# Altium footprint library d1_PcbLib.PcbLib: 266 footprints (part 10 of 17)
Each footprint in its own frame and in the unit in brackets; x right, y up, seen from the top. Pads: shape width x height; smd on the part's side, far side on the other; paste and mask are expansions set on the pad; w line width, h text height; cw(c..) or ccw(c..) is an arc to the next point about the centre after c.
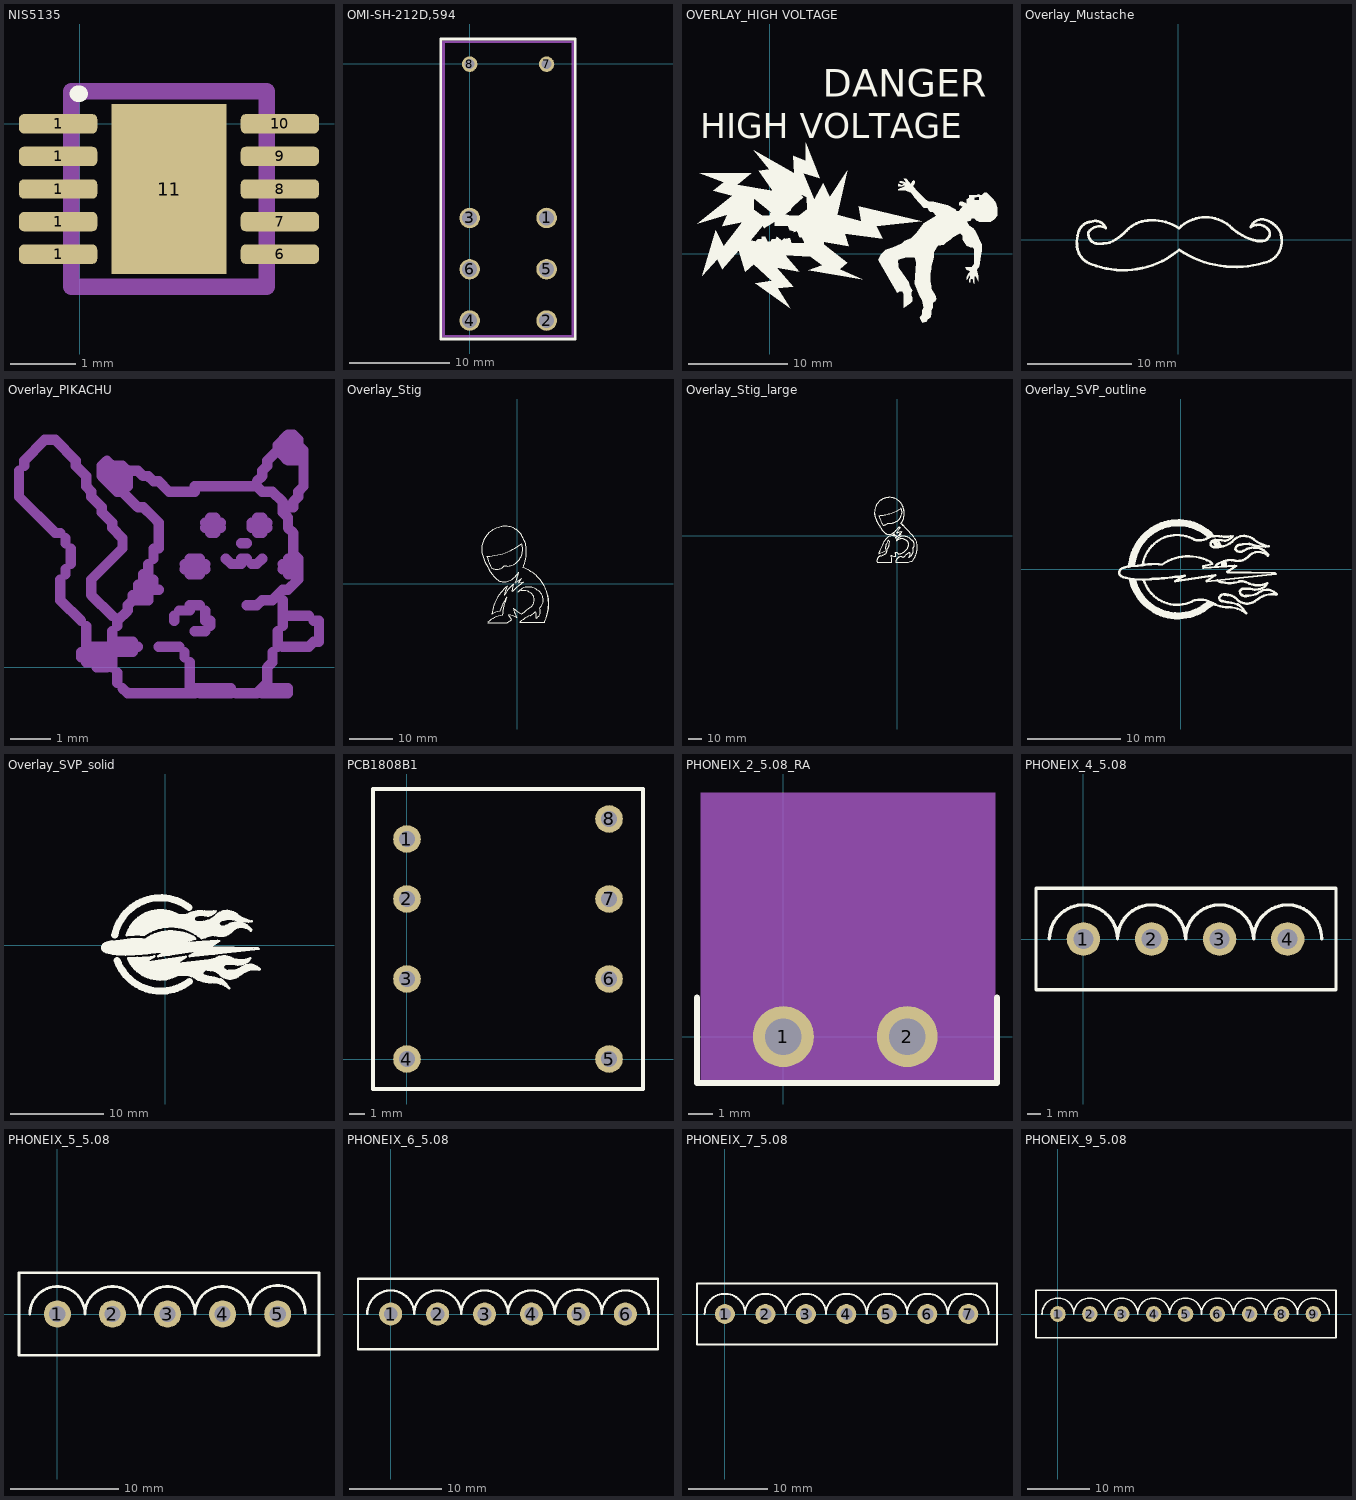
[diagram p9: the footprints below, top view; thin cyan lines are the x and y axes]

## NIS5135 [mm]
pads (11):
  rrect50% 1.2x0.297 smd: 1(-0.33,-2) 1(-0.33,-1.5) 1(-0.33,-1) 1(-0.33,-0.5) 1(-0.33,0) 6(3.07,-2) 7(3.07,-1.5) 8(3.07,-1) 9(3.07,-0.5) 10(3.07,0)
  rect 1.768x2.6 smd: 11(1.37,-1)
Top Overlay:
  lines w0.254: -0.025,0.457 0,0.457
Mechanical 13:
  lines w0.254: -0.13,-2.5 -0.13,0.5 2.87,0.5 2.87,-2.5 -0.13,-2.5
3D body: height 1, standoff 0, extent -0.13,-2.499 2.869,0.499

## OMI-SH-212D,594 [mil]
pads (8):
  round 80 hole 59: 1(299.57,-600.99) 2(299.57,-1000.99) 3(-0.43,-600.99) 4(-0.43,-1000.99) 5(299.57,-800.99) 6(-0.43,-800.99)
  round 60 hole 39: 7(299.57,-0.99) 8(-0.43,-0.99)
Top Overlay:
  lines w10: -113.43,-1072.99 -113.43,97.01 411.57,97.01 411.57,-1072.99 -113.43,-1072.99
Mechanical 1:
  lines w10: -102.43,-1062.99 -102.43,87.01 401.57,87.01 401.57,-1062.99 -102.43,-1062.99
3D body: height 811, standoff 0, extent -102.43,-1062.99 401.57,87.01
3D body: height 0, standoff -157, extent -12.42,-12.99 11.58,11.01
3D body: height 0, standoff -157, extent 287.58,-12.99 311.58,11.01
3D body: height 0, standoff -157, extent -19.93,-606.99 19.07,-594.99
3D body: height 0, standoff -157, extent -19.93,-806.99 19.07,-794.99
3D body: height 0, standoff -157, extent -19.93,-1006.99 19.07,-994.99
3D body: height 0, standoff -157, extent 280.07,-1006.99 319.07,-994.99
3D body: height 0, standoff -157, extent 280.07,-806.99 319.07,-794.99
3D body: height 0, standoff -157, extent 280.07,-606.99 319.07,-594.99

## OVERLAY_HIGH VOLTAGE [mm] "Scary Shocky Guy"
Top Overlay:
  drawing of 13 lines, arcs and shapes, not listed
  text "HIGH VOLTAGE" at -6.973,11.609 h2.54
  text "DANGER" at 5.346,15.8 h2.79

## Overlay_Mustache [mm]
Top Overlay:
  lines w0.254: -9.689,-0.655 ccw(c-7.696,-0.406) -8.331,-2.311 ccw(c-5.283,5.436) 0.09,-0.923 ; -9.667,-0.652 cw(c-6.81,-0.191) -9.565,0.696 cw(c-8.204,0.356) -8.331,1.753 cw(c-7.95,0.737) -6.934,1.118 ccw(c-7.569,0.102) -8.585,0.737 ccw(c-7.677,0.565) -7.848,-0.344 ccw(c-7.518,3.873) -6.54,-0.242 ccw(c-8.503,4.153) -4.959,0.896 cw(c-2.72,-1.216) -2.926,1.855 cw(c-2.426,-2.502) 0.051,1.118 cw(c2.591,-1.422) 5.131,1.118 ccw(c8.56,4.928) 7.53,-0.094 ccw(c7.757,2.741) 8.229,-0.063 ccw(c7.995,0.629) 8.687,0.864 ccw(c7.607,0.165) 6.909,1.245 cw(c7.988,0.8) 8.433,1.88 cw(c7.798,-0.025) 9.218,1.395 cw(c7.925,-0.129) 9.724,0.741 ; 0.137,-0.978 ccw(c5.448,7.023) 8.179,-2.184 ccw(c7.798,-0.152) 9.861,-0.281 ccw(c6.987,-0.106) 9.737,0.747

## Overlay_PIKACHU [mm]
Bottom Overlay:
  drawing of 362 lines, arcs and shapes, not listed

## Overlay_Stig [mm]
Top Overlay:
  lines w0.076: 6.239,-8.934 ccw(c-2.61,-4.606) 6.831,-1.793
  lines w0.254: -7.073,6.4 ccw(c-7.417,19.863) 0.965,9.322 cw(c-2.718,7.925) -1.321,4.242 cw(c-2.21,7.29) -3.066,4.232 cw(c-4.792,5.46) -6.02,3.734 cw(c2.934,8.877) -7.071,6.321 ; -6.925,-9.009 -2.39,-9.009 ccw(c-14.083,10.66) -1.315,-8.328 ccw(c-6.909,-11.113) -1.956,-7.303 ; -6.925,-8.947 cw(c-1.886,-14.975) -3.497,-7.285 cw(c8.077,-7.95) -2.464,-3.124 ccw(c9.538,-11.316) -4.12,-6.356 ; -5.946,-7.056 cw(c4.013,-8.331) -2.366,-0.578 ; -5.892,-7.063 cw(c-1.484,-15.25) -4.128,-6.336 ; -3.732,13.219 cw(c-2.752,9.059) -0.33,12.581 ; -3.169,13.298 ccw(c-2.352,6.582) -5.32,12.661 ccw(c-3.111,7.975) -7.798,5.766 ccw(c9.284,12.814) -5.473,1.692 ccw(c-3.021,3.519) -1.194,1.067 ccw(c-6.147,7.29) 0.301,2.633 cw(c-12.977,5.582) -0.386,0.436 ; -3.096,-2.657 cw(c9.919,-5.982) -2.374,-0.568 ; -3.051,-2.669 cw(c7.252,-8.903) -0.94,-0.076 ccw(c12.649,-4.394) -1.358,-1.726 ; -1.966,-7.167 cw(c-3.808,-14.723) -0.151,-7.859 cw(c7.633,-3.823) -0.94,-5.664 ccw(c4.775,0.305) 0.849,-6.967 ; -1.244,-1.804 cw(c10.363,-13.411) 1.346,0.305 ccw(c2.87,-9.474) 0.338,0.093 ; -0.463,0.283 ccw(c-11.862,17.958) 0.838,1.194 ccw(c15.443,-7.823) 0.24,0.144 ; -0.305,12.613 cw(c-3.828,8.075) 1.483,10.266 cw(c-3.088,7.82) 2.097,7.83 cw(c-8.242,7.607) 1.346,3.734 cw(c-2.492,-5.058) 2.118,3.355 cw(c-1.254,-4.607) 2.813,3.023 cw(c-2.328,-5.731) 3.766,2.389 cw(c-2.105,-5.254) 4.602,1.666 cw(c-2.406,-5.514) 5.3,0.912 cw(c-3.203,-5.67) 6.01,-0.125 cw(c-1.695,-4.944) 6.801,-1.718 ; 0.576,-8.896 6.299,-8.896 ccw(c-1.794,-4.74) 6.708,-7.979 ccw(c-1.829,-4.803) 6.975,-7.139 ccw(c-1.657,-4.771) 7.17,-6.254 ccw(c-2.386,-4.807) 7.278,-4.653 ccw(c-0.961,-4.378) 7.266,-3.866 ccw(c-1.208,-4.486) 7.121,-2.807 ccw(c-3.545,-5.663) 6.773,-1.729 ; 0.576,-8.887 cw(c5.99,-14.969) 2.977,-7.404 ccw(c-6.083,5.448) 4.186,-6.46 ; 0.981,-7.003 ccw(c-10.655,8.877) 2.616,-5.664 ccw(c1.791,-3.696) 3.759,-2.87 ccw(c1.473,-4.267) 0.076,-1.981 cw(c2.616,-4.013) 4.648,-1.473 cw(c3.378,-3.759) 5.163,-5.671 cw(c3.633,-6.419) 4.381,-7.949 ccw(c-0.586,-7.565) 4.282,-6.506

## Overlay_Stig_large [mm]
Top Overlay:
  lines w0.254: -17.043,16.815 ccw(c-11.836,16.688) -16.661,14.725 ; -16.936,15.923 cw(c-5.74,17.323) -11.582,26.975 ; -16.743,14.864 ccw(c-8.852,16.624) -16.311,13.505 ; -16.408,13.767 ccw(c-10.185,15.418) -15.908,12.467 ccw(c-11.601,13.248) -15.19,10.742 ccw(c-11.152,12.09) -14.438,9.383 ccw(c-4.851,13.193) -13.223,7.165 ; -13.624,-13.455 cw(c12.04,-19.507) -10.835,-6.393 ; -13.106,6.909 ccw(c-8.153,9.957) -12.757,6.403 ccw(c-0.294,13.657) -11.647,4.766 ; -13,-11.159 ccw(c3.081,-17.857) -13.843,-13.73 ccw(c-25.064,15.754) -8.874,-11.322 ; -12.598,-15.316 ccw(c-14.757,-4.521) -8.435,-13.534 ccw(c-13.545,-9.897) -7.273,-9.855 ccw(c-12.476,-5.66) -6.162,-7.853 ; -12.344,-15.316 ccw(c-11.328,-18.999) -15.011,-20.015 -3.962,-20.015 ccw(c-28.473,-20.142) -4.519,-14.946 ccw(c-1.262,-5.709) -1.158,-15.503 ccw(c-4.305,-14.653) -1.436,-13.106 ; -12.09,26.721 cw(c-5.867,17.45) 3.404,23.673 ; -11.963,5.258 ccw(c-3.327,9.703) -8.82,1.692 ; -11.21,-7.009 cw(c8.362,-16.985) -9.908,-4.787 cw(c1.314,-10.456) -7.102,-1.116 cw(c-1.994,-13.983) -3.327,-0.203 cw(c-2.184,-0.33) -2.057,0.813 ; -9.677,2.464 ccw(c-6.375,4.877) -5.813,0.826 ; -8.621,-11.139 cw(c2.212,-9.441) -8.616,-7.711 cw(c6.96,-12.903) -6.502,-3.505 ccw(c-1.168,-0.076) -5.894,-4.304 ; -6.205,-7.963 cw(c12.103,-7.252) -5.994,-4.394 ; -4.715,0.892 cw(c-5.516,5.047) -5.813,0.826 ; -3.708,1.448 ccw(c-8.026,8.941) -1.132,3.72 ; -2.86,-0.66 cw(c7.087,-6.68) -1.803,0.813 ; -2.61,-0.62 cw(c-0.152,-5.664) -0.66,-0.076 ccw(c3.531,-2.489) -1.289,-2.095 ; -1.355,-13.063 cw(c-0.597,-14.872) 1.118,-13.919 ccw(c-0.343,-4.458) 8.55,-8.003 ; -1.197,-2.103 cw(c4.928,-7.315) 2.769,0.432 ; -1.126,10.246 cw(c-6.156,20.43) -6.851,9.092 cw(c-13.921,21.974) -10.444,7.697 cw(c2.642,17.704) -13.614,15.037 ccw(c-16.027,50.978) 2.838,20.291 ; -0.905,10.321 ccw(c-5.232,18.212) 3.658,16.815 ; -0.66,-4.267 cw(c3.467,-8.014) 7.214,-3.886 cw(c5.245,-6.744) 8.103,-8.712 ; -0.66,-4.013 cw(c4.42,-5.918) 4.555,-0.494 ; 1.499,0.94 ccw(c4.547,11.989) 2.442,0.722 ; 1.753,1.067 ccw(c-3.581,9.83) 3.609,2.513 ; 2.172,5.898 cw(c5.804,10.652) 1.426,6.575 cw(c-12.618,15.934) -2.466,2.453 cw(c-5.58,4.602) -5.813,0.826 ; 2.177,5.905 cw(c-26.695,20.879) -0.152,2.083 ccw(c-3.772,15.735) 2.819,3.243 ; 2.896,9.068 ccw(c-3.327,14.656) 5.021,14.157 ; 2.896,9.195 ccw(c9.627,13.894) 4.345,7.61 ; 2.92,20.454 cw(c-2.629,17.386) 3.658,16.561 ; 3.021,3.113 ccw(c12.518,18.005) 3.621,2.747 ; 3.141,23.847 cw(c-5.55,17.513) 5.163,18.453 ; 3.277,-15.697 ccw(c4.42,-14.554) 5.563,-15.697 ; 3.404,-15.824 ccw(c3.467,-20.46) -1.148,-20.017 ccw(c2.651,35.599) 4.251,-20.124 7.359,-20.124 ; 3.734,8.292 cw(c-51.714,-52.146) 11.024,0.686 ; 4.034,-0.471 cw(c4.166,-10.363) 11.532,-3.759 ; 4.434,21.82 cw(c-6.909,17.114) 5.238,15.31 cw(c-3.454,15.545) 5.109,14.034 ; 5.365,-15.875 cw(c16.04,-25.54) 9.373,-12.776 cw(c7.214,-14.173) 8.611,-16.332 ccw(c6.896,-11.316) 11.913,-9.601 ccw(c8.42,-6.871) 11.151,-3.378 ; 7.536,-20.101 ccw(c1.753,9.195) 11.77,-18.936 ; 10.139,1.764 cw(c-15.583,-21.405) 14.382,-4.069 cw(c1.1,-8.856) 14.451,-13.445 cw(c-2.629,-8.522) 11.913,-18.745

## Overlay_SVP_outline [mm]
Top Overlay:
  lines w0.254: -6.579,-0.406 ccw(c-6.007,-0.292) -6.373,-0.746 ; -6.579,-0.356 cw(c-5.944,-0.457) -6.221,0.123 ; -6.353,-0.756 ccw(c-4.801,3.073) -5.888,-0.914 ; -6.223,0.127 cw(c-4.394,-5.055) -5.938,0.219 ; -5.944,0.229 cw(c-4.661,-5.194) -5.521,0.311 ; -5.867,-0.914 ccw(c-3.873,7.556) -5.005,-1.072 ; -5.54,0.352 cw(c-0.59,-0.32) -5.473,0.731 ; -5.537,0.279 cw(c-4.191,-7.468) -4.572,0.386 ; -5.41,-0.991 ccw(c-0.426,-0.665) -5.363,-1.425 ; -5.029,-1.067 ccw(c-4.089,7.747) -3.119,-1.064 ; -4.572,0.381 cw(c-3.454,-7.518) -3.847,0.45 ; -4.061,0.439 cw(c-0.359,-0.076) 1.51,3.16 ; -3.935,-1.164 ccw(c-0.359,-0.076) 1.51,-3.313 ; -3.857,0.46 cw(c-2.756,-5.829) -1.981,0.508 cw(c0.838,-3.607) 3.158,0.809 ; -3.277,-1.047 ccw(c-3.277,3.073) -2.769,-1.016 ; -2.866,-1.012 ccw(c-2.591,4.623) -2.032,-0.991 ; -2.045,-0.984 ccw(c-2.134,4.724) -1.092,-0.889 ; -1.143,-0.889 ccw(c-1.399,4.119) -0.582,-0.829 ; -0.584,-1.295 3.683,-0.635 ; -0.573,-0.818 ccw(c-0.978,5.855) 0.406,-0.686 ; -0.552,-1.264 0.432,-0.686 ; 1.335,-3.35 cw(c2.057,-6.071) 3.734,-3.81 ; 1.433,3.156 ccw(c1.943,5.626) 2.718,3.226 ; 2.413,0.127 5.766,0.381 ; 2.445,0.311 3.378,0.559 ; 2.733,3.269 cw(c3.912,0.94) 4.394,3.505 ; 2.794,-1.321 10.217,-0.516 ; 2.819,-1.245 3.734,-0.635 ; 3.175,-3.988 ccw(c0.105,-0.047) 3.479,-3.731 ; 3.175,0.787 cw(c2.184,-0.737) 3.352,0.656 ; 3.2,2.667 cw(c3.645,2.654) 3.658,3.099 ; 3.226,2.565 ccw(c3.683,2.896) 3.798,2.343 ; 3.231,3.914 cw(c-0.783,0.941) 3.463,3.571 ; 3.531,2.897 cw(c-0.483,-0.076) 3.89,2.339 ; 3.709,-3.766 ccw(c5.004,-1.092) 5.385,-4.039 ; 3.715,0.285 cw(c4.521,-0.203) 4.445,0.737 ; 3.73,3.135 cw(c3.835,-1.372) 4.724,3.048 ; 3.735,2.948 cw(c-0.279,-0.025) 4.093,2.39 ; 3.779,2.339 ccw(c3.823,4.991) 5.512,2.946 cw(c6.794,1.918) 7.823,3.2 ; 3.938,3.1 cw(c-0.076,0.127) 4.339,2.463 ; 3.953,-1.194 ccw(c4.61,-0.394) 4.496,-1.422 ; 4.166,-2.972 cw(c4.712,-3.315) 5.055,-2.769 ; 4.166,-2.921 ccw(c4.534,-3.061) 4.394,-3.429 ; 4.381,3.522 ccw(c4.915,6.49) 5.613,3.556 ; 4.394,-3.378 ccw(c5.055,-1.93) 4.971,-3.52 ; 4.418,0.711 cw(c-0.533,0.051) 4.456,0.286 ; 4.42,0.737 cw(c5.364,-0.964) 5.91,0.903 ; 4.496,-1.412 ccw(c5.245,2.019) 6.248,-1.346 ; 4.633,0.804 cw(c-0.305,0.051) 4.685,0.286 ; 4.71,-2.725 cw(c4.851,-4.394) 6.121,-3.302 ; 4.804,3.03 ccw(c4.445,4.496) 5.537,3.454 ; 4.811,0.855 cw(c-0.127,0.102) 4.863,0.337 ; 4.985,-0.273 5.973,0.35 ; 5.029,-0.33 10.109,-0.406 ; 5.091,-3.521 cw(c4.572,-7.544) 6.096,-3.785 ; 5.292,-4.079 cw(c5.194,-7.023) 7.036,-4.724 ; 5.852,0.907 ccw(c6.134,2.451) 7.341,1.448 ; 6.094,-3.75 cw(c4.928,-5.74) 6.96,-4.648 ; 6.106,-3.311 ccw(c7.112,-2.134) 8.128,-3.302 ; 6.274,-1.297 cw(c6.452,-2.972) 7.391,-1.575 ; 6.35,-2.362 cw(c6.782,-2.54) 6.96,-2.108 ; 6.375,-2.337 ccw(c6.693,-2.451) 6.579,-2.769 ; 6.401,2.616 cw(c7.099,-0.165) 7.662,2.647 ; 6.452,2.616 ccw(c6.401,2.083) 5.867,2.134 ccw(c6.375,2.464) 6.706,1.956 ; 6.553,-2.794 ccw(c6.96,-1.905) 7.21,-2.85 ; 6.756,1.956 cw(c7.861,0.445) 9.373,1.549 ; 6.802,-2.094 cw(c7.099,-4.178) 7.696,-2.159 ; 6.964,-2.827 ccw(c7.15,-0.318) 8.28,-2.565 cw(c9.233,-3.645) 10.312,-2.692 ; 7.29,1.397 cw(c8.331,0.406) 9.322,1.448 ; 7.355,2.717 ccw(c9.055,7.48) 9.449,2.438 ; 7.366,-1.575 ccw(c8.025,0.267) 8.076,-1.689 ; 7.712,-2.167 ccw(c8.014,0.775) 8.382,-2.159 ; 7.819,3.195 ccw(c10.198,6.159) 9.423,2.438 ; 7.989,-1.716 ccw(c8.166,1.13) 9.271,-1.499 ; 8.232,-3.219 cw(c9.792,-5.22) 10.211,-2.718 ; 8.348,-2.154 ccw(c8.191,-0.953) 9.246,-1.549
  lines w0.762: -5.205,0.641 cw(c-0.254,-0.025) 3.016,3.751 ; -5.096,-1.325 ccw(c-0.279,0) 3.002,-3.766

## Overlay_SVP_solid [mm]
Top Overlay:
  drawing of 84 lines, arcs and shapes, not listed

## PCB1808B1 [mm]
pads (8):
  round 1.75 hole 1: 1(0,13.97) 2(0,10.16) 3(0,5.08) 4(0,0) 5(12.83,0) 6(12.83,5.08) 7(12.83,10.16) 8(12.83,15.24)
Top Overlay:
  lines w0.254: 15,-1.905 -2.17,-1.905 -2.17,17.145 15,17.145 15,-1.9
3D body: height 15.89, standoff -4.34, extent -1.93,-2.035 14.73,17.2

## PHONEIX_2_5.08_RA [mm]
height 15
pads (2):
  round 2.5 hole 1.5: 1(0,0) 2(5.08,0)
Top Overlay:
  lines w0.254: -3.54,-1.9 -3.54,1.6 ; -3.5,-1.9 8.7,-1.9 ; 8.76,-1.9 8.76,1.6
Mechanical 1:
  rectangle: -3.4,-2 8.7,10
3D body: height 8.6, standoff -3.5, extent -3.54,-2.007 8.62,9.996

## PHONEIX_4_5.08 [mm] "1755752"
height 27.178
pads (4):
  round 2.5 hole 1.5: 1(0,0) 2(5.08,0) 3(10.16,0) 4(15.24,0)
Top Overlay:
  lines w0.254: -2.54,0 cw(c0,0) 2.54,0 cw(c5.08,0) 7.62,0 cw(c10.16,0) 12.7,0 cw(c15.24,0) 17.78,0 ; -3.54,-3.8 -3.54,3.8 18.847,3.8 18.847,-3.8 -3.54,-3.8
3D body: height 12, standoff -3.9, extent -3.531,-4.808 18.789,3.792

## PHONEIX_5_5.08 [mm]
pads (5):
  round 2.5 hole 1.5: 1(0,0) 2(5.08,0) 3(10.16,0) 4(15.24,0) 5(20.32,0)
Top Overlay:
  lines w0.254: -2.54,0 cw(c0,0) 2.54,0 cw(c5.08,0) 7.62,0 cw(c10.16,0) 12.7,0 cw(c15.24,0) 17.78,0 ; 17.78,0.1 cw(c20.32,0.1) 22.86,0.1 ; -3.54,-3.8 -3.54,3.8 24.13,3.8 24.13,-3.8 -3.54,-3.8
3D body: height 12, standoff -3.9, extent -3.524,-4.815 23.876,3.785

## PHONEIX_6_5.08 [mm]
pads (6):
  round 2.5 hole 1.5: 1(0,0) 2(5.08,0) 3(10.16,0) 4(15.24,0) 5(20.32,0) 6(25.4,0)
Top Overlay:
  lines w0.254: -2.54,0 cw(c0,0) 2.54,0 cw(c5.08,0) 7.62,0 cw(c10.16,0) 12.7,0 cw(c15.24,0) 17.78,0 ; 17.78,0.1 cw(c20.32,0.1) 22.86,0.1 ; 22.86,0 cw(c25.4,0) 27.94,0 ; -3.54,-3.8 28.94,-3.8 28.94,3.8 -3.54,3.8 -3.54,-3.8
3D body: height 12, standoff -3.9, extent -3.529,-4.803 28.951,3.797

## PHONEIX_7_5.08 [mm]
pads (7):
  round 2.5 hole 1.5: 1(0,0) 2(5.08,0) 3(10.16,0) 4(15.24,0) 5(20.32,0) 6(25.4,0) 7(30.54,0)
Top Overlay:
  lines w0.254: -2.54,0 cw(c0,0) 2.54,0 ; 2.52,0 cw(c5.06,0) 7.6,0 ; 7.62,0 cw(c10.16,0) 12.7,0 cw(c15.24,0) 17.78,0 ; 17.8,0 cw(c20.34,0) 22.88,0 ; 22.86,0 cw(c25.4,0) 27.94,0 ; 28,0 cw(c30.54,0) 33.08,0 ; -3.5,-1.9 -3.5,-1.9 ; -3.5,-1.9 -3.5,-3.8 34.14,-3.8 34.14,3.8 -3.5,3.8 -3.5,1.9 ; -3.5,-1.9 -3.5,-0.95 -3.5,0.95 -3.5,1.9 ; -3.5,1.9 -3.5,1.9
3D body: height 12, standoff -3.9, extent -3.56,-4.8 34,3.8

## PHONEIX_9_5.08 [mm]
pads (9):
  round 2.5 hole 1.5: 1(0,0) 2(5.08,0) 3(10.16,0) 4(15.24,0) 5(20.32,0) 6(25.4,0) 7(30.54,0) 8(35.62,0) 9(40.7,0)
Top Overlay:
  lines w0.254: -2.54,0 cw(c0,0) 2.54,0 ; 2.52,0 cw(c5.06,0) 7.6,0 ; 7.62,0 cw(c10.16,0) 12.7,0 cw(c15.24,0) 17.78,0 ; 17.8,0 cw(c20.34,0) 22.88,0 ; 22.86,0 cw(c25.4,0) 27.94,0 ; 28,0 cw(c30.54,0) 33.08,0 ; 33.1,0 cw(c35.64,0) 38.18,0 ; 38.16,0 cw(c40.7,0) 43.24,0 ; -3.5,-1.9 -3.5,-1.9 ; -3.5,-1.9 -3.5,-3.8 44.3,-3.8 44.3,-1.74 44.3,1.74 44.3,3.8 -3.5,3.8 -3.5,1.9 ; -3.5,-1.9 -3.5,-0.95 -3.5,0.95 -3.5,1.9 ; -3.5,1.9 -3.5,1.9
3D body: height 12, standoff -3.9, extent -3.569,-4.803 44.151,3.797